# Altium integrated library Cap-Cer-SMD_V2.IntLib: 957 symbols (part 1 of 7) (continued)
## 1nF_0805N_16V_10%_X7R
designator C?, comment value 1.0nF  Voltage: 16V  Text1: 0805  (hidden comment: 1nF_C0805_16V_10%_X7R)
Cap Ceramic X7R; Manufacturer: Various; Part Number: 1.0nF 0805 16V 10% X7R; Tol: 10%; Package: CAPC0805X110N; EDM-PN: *; Text2: *; SAAB PN: *; DCE Part No: *
footprint CAPC0805X110N (Chip Capacitor, 0805, 2-Leads, Body 2.0x1.3mm, IPC Medium Density)
pins: 1, 2

## 1nF_0805N_50V_5%_C0G/NP0
designator C?, comment value 1.0nF  Voltage: 50V  Text1: 0805  (hidden comment: 1nF_C0805_50V_5%_C0G/NP0)
Cap Ceramic C0G/NP0; Manufacturer: Various; Part Number: 1.0nF 0805 50V 5% C0G/NP0; Tol: 5%; Package: CAPC0805X110N; EDM-PN: *; Text2: *; SAAB PN: *; DCE Part No: *
footprint CAPC0805X110N (Chip Capacitor, 0805, 2-Leads, Body 2.0x1.3mm, IPC Medium Density)
pins: 1, 2

## 1nF_0805N_50V_10%_X7R
designator C?, comment value 1.0nF  Voltage: 50V  Text1: 0805  (hidden comment: 1nF_C0805_50V_10%_X7R)
Cap Ceramic X7R; Manufacturer: Various; Part Number: 1.0nF 0805 50V 10% X7R; EDM-PN: CAP49; Tol: 10%; SAAB PN: 1AAB00007AEA; Package: CAPC0805X110N; Text2: *; DCE Part No: *
footprint CAPC0805X110N (Chip Capacitor, 0805, 2-Leads, Body 2.0x1.3mm, IPC Medium Density)
pins: 1, 2

## 1nF_0805N_50V_10%_X7R-DNF
designator C?, comment value (1.0nF)  Voltage: 50V  Text1: 0805  (hidden comment: 1nF_C0805_50V_10%_X7R-DNF)
Cap Ceramic X7R - Do not Fit; Manufacturer: Various; Part Number: DNF - 1.0nF 0805 50V 10% X7R; Tol: 10%; SAAB PN: 1AAB00007AEA; Package: CAPC0805X110N; EDM-PN: *; Text2: *; DCE Part No: *
footprint CAPC0805X110N (Chip Capacitor, 0805, 2-Leads, Body 2.0x1.3mm, IPC Medium Density)
pins: 1, 2

## 1nF_0805N_100V_10%_X7R
designator C?, comment value 1.0nF  Voltage: 100V  Text1: 0805  (hidden comment: 1nF_C0805_100V_10%_X7R)
Cap Ceramic X7R; Manufacturer: Various; Part Number: 1.0nF 0805 100V 10% X7R; Tol: 10%; Package: CAPC0805X110N; EDM-PN: *; Text2: *; SAAB PN: *; DCE Part No: *
footprint CAPC0805X110N (Chip Capacitor, 0805, 2-Leads, Body 2.0x1.3mm, IPC Medium Density)
pins: 1, 2

## 1nF_0805N_200V_10%_X7R
designator C?, comment value 1.0nF  Voltage: 200V  Text1: 0805  (hidden comment: 1nF_C0805_200V_10%_X7R)
Cap Ceramic X7R; Manufacturer: Various; Part Number: 1.0nF 0805 200V 10% X7R; Tol: 10%; Package: CAPC0805X110N; EDM-PN: *; Text2: *; SAAB PN: *; DCE Part No: *
footprint CAPC0805X110N (Chip Capacitor, 0805, 2-Leads, Body 2.0x1.3mm, IPC Medium Density)
pins: 1, 2

## 1nF_1206N_1kV_10%_X7R
designator C?, comment value 1.0nF  Voltage: 1kV  Text1: 1206  (hidden comment: 1.0nF_C1206_1kV_10%_X7R)
Cap Ceramic X7R; Manufacturer: Various; Part Number: 1.0nF 1206 1kV 10% X7R; Tol: 10%; Package: CAPC1206X135N; EDM-PN: *; Text2: *; SAAB PN: *; DCE Part No: *
footprint CAPC1206X135N (Chip Capacitor, 1206, 2-Leads, Body 3.2x1.6mm, IPC Medium Density)
pins: 1, 2

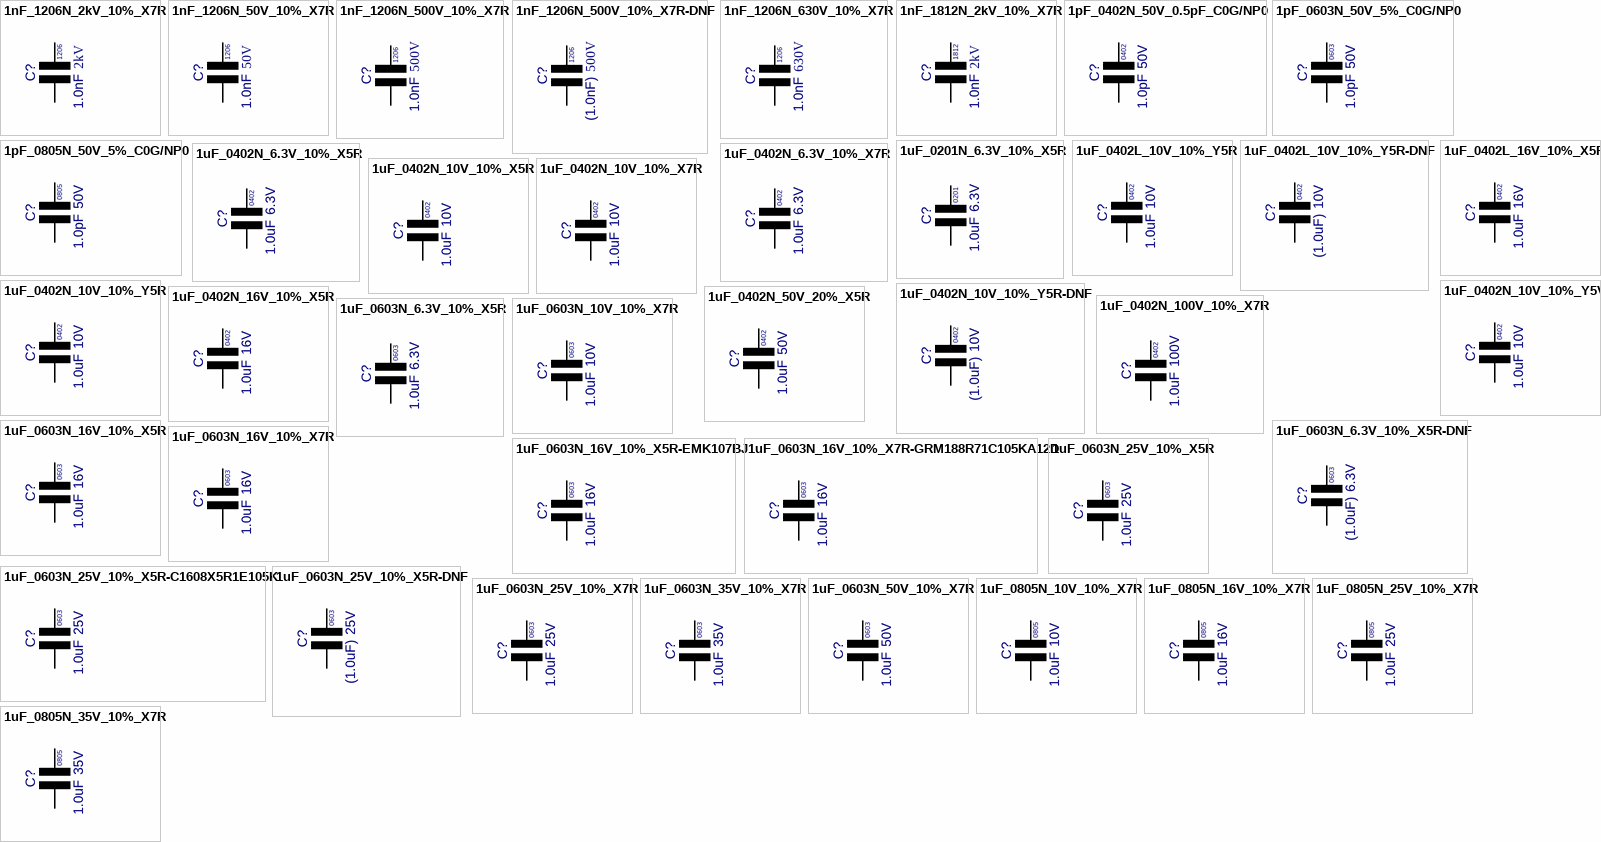
[diagram p2: symbols 1nF_1206N_2kV_10%_X7R to 1uF_0805N_35V_10%_X7R]

## 1nF_1206N_2kV_10%_X7R
designator C?, comment value 1.0nF  Voltage: 2kV  Text1: 1206  (hidden comment: 1.0nF_C1206_2kV_10%_X7R)
Cap Ceramic X7R; Manufacturer: Various; Part Number: 1.0nF 1206 2kV 10% X7R; EDM-PN: CAP777; Tol: 10%; Reutech PN: 5910-CA-0558; Package: CAPC1206X178N; Text2: *; SAAB PN: *; DCE Part No: *
footprint CAPC1206X178N (Chip Capacitor, 1206, 2-Leads, Body 3.2x1.6mm, IPC Medium Density)
pins: 1, 2

## 1nF_1206N_50V_10%_X7R
designator C?, comment value 1.0nF  Voltage: 50V  Text1: 1206  (hidden comment: 1.0nF_C1206_50V_10%_X7R)
Cap Ceramic X7R; Manufacturer: Various; Part Number: 1.0nF 1206 50V 10% X7R; Tol: 10%; Package: CAPC1206X135N; EDM-PN: *; Text2: *; SAAB PN: *; DCE Part No: *
footprint CAPC1206X135N (Chip Capacitor, 1206, 2-Leads, Body 3.2x1.6mm, IPC Medium Density)
pins: 1, 2

## 1nF_1206N_500V_10%_X7R
designator C?, comment value 1.0nF  Voltage: 500V  Text1: 1206  (hidden comment: 1.0nF_C1206_500V_10%_X7R)
Cap Ceramic X7R; Manufacturer: Various; Part Number: 1.0nF 1206 500V 10% X7R; Tol: 10%; Reutech PN: 5910-CA-0470; Package: CAPC1206X135N; EDM-PN: *; Text2: *; SAAB PN: *; DCE Part No: *
footprint CAPC1206X135N (Chip Capacitor, 1206, 2-Leads, Body 3.2x1.6mm, IPC Medium Density)
pins: 1, 2

## 1nF_1206N_500V_10%_X7R-DNF
designator C?, comment value (1.0nF)  Voltage: 500V  Text1: 1206  (hidden comment: 1.0nF_C1206_500V_10%_X7R-DNF)
Cap Ceramic X7R - Do not Fit; Manufacturer: Various; Part Number: DNF - 1.0nF 1206 500V 10% X7R; Tol: 10%; Reutech PN: 5910-CA-0470; Package: CAPC1206X135N; EDM-PN: *; Text2: *; SAAB PN: *; DCE Part No: *
footprint CAPC1206X135N (Chip Capacitor, 1206, 2-Leads, Body 3.2x1.6mm, IPC Medium Density)
pins: 1, 2

## 1nF_1206N_630V_10%_X7R
designator C?, comment value 1.0nF  Voltage: 630V  Text1: 1206  (hidden comment: 1.0nF_C1206_630V_10%_X7R)
Cap Ceramic X7R; Manufacturer: Various; Part Number: 1.0nF 1206 630V 10% X7R; Tol: 10%; Package: CAPC1206X135N; EDM-PN: *; Text2: *; SAAB PN: *; DCE Part No: *
footprint CAPC1206X135N (Chip Capacitor, 1206, 2-Leads, Body 3.2x1.6mm, IPC Medium Density)
pins: 1, 2

## 1nF_1812N_2kV_10%_X7R
designator C?, comment value 1.0nF  Voltage: 2kV  Text1: 1812  (hidden comment: 1.0nF_C1812_2kV_10%_X7R)
Cap Ceramic X7R; Manufacturer: Various; Part Number: 1.0nF 1812 2kV 10% X7R; Tol: 10%; Package: CAPC1812X280N; EDM-PN: *; Text2: *; SAAB PN: *; DCE Part No: *
footprint CAPC1812X280N (Chip Capacitor, 1812, 2-Leads, Body 4.5x3.2mm, IPC Medium Density)
pins: 1, 2

## 1pF_0402N_50V_0.5pF_C0G/NP0
designator C?, comment value 1.0pF  Voltage: 50V  Text1: 0402  (hidden comment: 1.0pF_C0402_50V_0.5_C0G/NP0)
Cap Ceramic C0G/NP0; Manufacturer: Various; Part Number: 1.0pF 0402 50V 0.5 C0G/NP0; Tol: 0.5pF; Package: CAPC0402X60N; EDM-PN: *; Text2: *; SAAB PN: *; DCE Part No: *
footprint CAPC0402X60N (Chip Capacitor, 0402, 2-Leads, Body 1.0x0.5mm, IPC Medium Density)
pins: 1, 2

## 1pF_0603N_50V_5%_C0G/NP0
designator C?, comment value 1.0pF  Voltage: 50V  Text1: 0603  (hidden comment: 1.0pF_C0603_50V_5%_C0G/NP0)
Cap Ceramic C0G/NP0; Manufacturer: Various; Part Number: 1.0pF 0603 50V 5% C0G/NP0; EDM-PN: CAP1349; Tol: 5%; Package: CAPC0603X85N; Text2: *; SAAB PN: *; DCE Part No: *
footprint CAPC0603X85N (Chip Capacitor, 0603, 2-Leads, Body 1.6x0.8mm, IPC Medium Density)
pins: 1, 2

## 1pF_0805N_50V_5%_C0G/NP0
designator C?, comment value 1.0pF  Voltage: 50V  Text1: 0805  (hidden comment: 1pF_C0805_50V_5%_C0G/NP0)
Cap Ceramic C0G/NP0; Manufacturer: Various; Part Number: 1.0pF 0805 50V 5% C0G/NP0; Tol: 0.5pF; Package: CAPC0805X110N; EDM-PN: *; Text2: *; SAAB PN: *; DCE Part No: *
footprint CAPC0805X110N (Chip Capacitor, 0805, 2-Leads, Body 2.0x1.3mm, IPC Medium Density)
pins: 1, 2

## 1uF_0201N_6.3V_10%_X5R
designator C?, comment value 1.0uF  Voltage: 6.3V  Text1: 0201  (hidden comment: 1uF_C0201_6.3V_10%_X5R)
Cap Ceramic X5R; Manufacturer: Various; Part Number: 1uF 0201 6.3V 10% X5R; Tol: 10%; Package: CAPC0201X33N; EDM-PN: *; Text2: *; SAAB PN: *; DCE Part No: *
footprint CAPC0201X33N (Chip Capacitor, 0201, 2-Leads, Body 0.6x0.3mm, IPC Medium Density)
pins: 1, 2

## 1uF_0402L_10V_10%_Y5R
designator C?, comment value 1.0uF  Voltage: 10V  Text1: 0402  (hidden comment: 1uF_C0402_10V_10%_X5R)
Cap Ceramic Y5R; Manufacturer: Various; Part Number: 1.0uF 0402 10V 10% Y5R; Tol: 10%; Package: CAPC0402X60L; EDM-PN: *; Text2: *; SAAB PN: *; DCE Part No: *
footprint CAPC0402X60L (Chip Capacitor, 0402, 2-Leads, Body 1.0x0.5mm, IPC High Density)
pins: 1, 2

## 1uF_0402L_10V_10%_Y5R-DNF
designator C?, comment value (1.0uF)  Voltage: 10V  Text1: 0402  (hidden comment: 1uF_C0402_10V_10%_X5R-DNF)
Cap Ceramic Y5R - Do not Fit; Manufacturer: Various; Part Number: DNF - 1.0uF 0402 10V 10% Y5R; Tol: 10%; Package: CAPC0402X60L; EDM-PN: *; Text2: *; SAAB PN: *; DCE Part No: *
footprint CAPC0402X60L (Chip Capacitor, 0402, 2-Leads, Body 1.0x0.5mm, IPC High Density)
pins: 1, 2

## 1uF_0402L_16V_10%_X5R
designator C?, comment value 1.0uF  Voltage: 16V  Text1: 0402  (hidden comment: 1uF_C0402_16V_10%_X5R)
Cap Ceramic X5R; Manufacturer: Various; Part Number: 1.0uF 0402 16V 10% X5R; EDM-PN: CAP863; Tol: 10%; Package: CAPC0402X60L; Text2: *; SAAB PN: *; DCE Part No: *
footprint CAPC0402X60L (Chip Capacitor, 0402, 2-Leads, Body 1.0x0.5mm, IPC High Density)
pins: 1, 2

## 1uF_0402N_6.3V_10%_X5R
designator C?, comment value 1.0uF  Voltage: 6.3V  Text1: 0402  (hidden comment: 1uF_C0402_6.3V_10%_X5R)
Cap Ceramic X5R; Manufacturer: Various; Part Number: 1.0uF 0402 6.3V 10% X5R; DCE Part No: 7167; EDM-PN: CAP330; Tol: 10%; Package: CAPC0402X60N; Text2: *; SAAB PN: *
footprint CAPC0402X60N (Chip Capacitor, 0402, 2-Leads, Body 1.0x0.5mm, IPC Medium Density)
pins: 1, 2

## 1uF_0402N_6.3V_10%_X7R
designator C?, comment value 1.0uF  Voltage: 6.3V  Text1: 0402  (hidden comment: 1uF_C0402_6.3V_10%_X7R)
Cap Ceramic X7R; Manufacturer: Various; Part Number: 1.0uF 0402 6.3V 10% X7R; Tol: 10%; Package: CAPC0402X60N; EDM-PN: *; Text2: *; SAAB PN: *; DCE Part No: *
footprint CAPC0402X60N (Chip Capacitor, 0402, 2-Leads, Body 1.0x0.5mm, IPC Medium Density)
pins: 1, 2

## 1uF_0402N_10V_10%_X5R
designator C?, comment value 1.0uF  Voltage: 10V  Text1: 0402  (hidden comment: 1uF_C0402_10V_10%_X5R)
Cap Ceramic X5R; Manufacturer: Various; Part Number: 1.0uF 0402 10V 10% X5R; Tol: 10%; Package: CAPC0402X60N; EDM-PN: *; Text2: *; SAAB PN: *; DCE Part No: *
footprint CAPC0402X60N (Chip Capacitor, 0402, 2-Leads, Body 1.0x0.5mm, IPC Medium Density)
pins: 1, 2

## 1uF_0402N_10V_10%_X7R
designator C?, comment value 1.0uF  Voltage: 10V  Text1: 0402  (hidden comment: 1uF_C0402_10V_10%_X7R)
Cap Ceramic X7R; Manufacturer: Various; Part Number: 1.0uF 0402 10V 10% X7R; Tol: 10%; Package: CAPC0402X60N; EDM-PN: *; Text2: *; SAAB PN: *; DCE Part No: *
footprint CAPC0402X60N (Chip Capacitor, 0402, 2-Leads, Body 1.0x0.5mm, IPC Medium Density)
pins: 1, 2

## 1uF_0402N_10V_10%_Y5R
designator C?, comment value 1.0uF  Voltage: 10V  Text1: 0402  (hidden comment: 1uF_C0402_10V_10%_X5R)
Cap Ceramic Y5R; Manufacturer: Various; Part Number: 1.0uF 0402 10V 10% Y5R; Tol: 10%; Package: CAPC0402X60N; EDM-PN: *; Text2: *; SAAB PN: *; DCE Part No: *
footprint CAPC0402X60N (Chip Capacitor, 0402, 2-Leads, Body 1.0x0.5mm, IPC Medium Density)
pins: 1, 2

## 1uF_0402N_10V_10%_Y5R-DNF
designator C?, comment value (1.0uF)  Voltage: 10V  Text1: 0402  (hidden comment: 1uF_C0402_10V_10%_X5R-DNF)
Cap Ceramic Y5R - Do not Fit; Manufacturer: Various; Part Number: DNF - 1.0uF 0402 10V 10% Y5R; Tol: 10%; Package: CAPC0402X60N; EDM-PN: *; Text2: *; SAAB PN: *; DCE Part No: *
footprint CAPC0402X60N (Chip Capacitor, 0402, 2-Leads, Body 1.0x0.5mm, IPC Medium Density)
pins: 1, 2

## 1uF_0402N_10V_10%_Y5V
designator C?, comment value 1.0uF  Voltage: 10V  Text1: 0402  (hidden comment: 1uF_C0402_10V_10%_X5V)
Cap Ceramic Y5R; Manufacturer: Various; Part Number: 1.0uF 0402 10V 10% Y5V; EDM-PN: CAP505; Tol: 10%; Package: CAPC0402X60N; Text2: *; SAAB PN: *; DCE Part No: *
footprint CAPC0402X60N (Chip Capacitor, 0402, 2-Leads, Body 1.0x0.5mm, IPC Medium Density)
pins: 1, 2

## 1uF_0402N_16V_10%_X5R
designator C?, comment value 1.0uF  Voltage: 16V  Text1: 0402  (hidden comment: 1uF_C0402_16V_10%_X5R)
Cap Ceramic X5R; Manufacturer: Various; Part Number: 1.0uF 0402 16V 10% X5R; EDM-PN: CAP863; Tol: 10%; Package: CAPC0402X60N; Text2: *; SAAB PN: *; DCE Part No: *
footprint CAPC0402X60N (Chip Capacitor, 0402, 2-Leads, Body 1.0x0.5mm, IPC Medium Density)
pins: 1, 2

## 1uF_0402N_50V_20%_X5R
designator C?, comment value 1.0uF  Voltage: 50V  Text1: 0402  (hidden comment: 1uF_C0402_50V_20%_X5R)
Cap Ceramic X5R; Manufacturer: Various; Part Number: 1.0uF 0402 50V 20% X5R; EDM-PN: CAP1424; Tol: 20%; Package: CAPC0402X60N; Text2: *; SAAB PN: *; DCE Part No: *
footprint CAPC0402X60N (Chip Capacitor, 0402, 2-Leads, Body 1.0x0.5mm, IPC Medium Density)
pins: 1, 2

## 1uF_0402N_100V_10%_X7R
designator C?, comment value 1.0uF  Voltage: 100V  Text1: 0402  (hidden comment: 1uF_C0402_100V_10%_X7R)
Cap Ceramic X7R; Manufacturer: Various; Part Number: 1.0uF 0402 100V 10% X7R; Tol: 10%; Package: CAPC0402X60N; EDM-PN: *; Text2: *; SAAB PN: *; DCE Part No: *
footprint CAPC0402X60N (Chip Capacitor, 0402, 2-Leads, Body 1.0x0.5mm, IPC Medium Density)
pins: 1, 2

## 1uF_0603N_6.3V_10%_X5R
designator C?, comment value 1.0uF  Voltage: 6.3V  Text1: 0603  (hidden comment: 1.0uF_C0603_6.3V_10%_X5R)
Cap Ceramic X5R; Manufacturer: Various; Part Number: 1.0uF 0603 6.3V 10% X5R; EDM-PN: CAP1238; Tol: 10%; Package: CAPC0603X85N; Text2: *; SAAB PN: *; DCE Part No: *
footprint CAPC0603X85N (Chip Capacitor, 0603, 2-Leads, Body 1.6x0.8mm, IPC Medium Density)
pins: 1, 2

## 1uF_0603N_6.3V_10%_X5R-DNF
designator C?, comment value (1.0uF)  Voltage: 6.3V  Text1: 0603  (hidden comment: 1.0uF_C0603_6.3V_10%_X5R)
Cap Ceramic X5R - Do not Fit; Manufacturer: Various; Part Number: DNF - 1.0uF 0603 6.3V 10% X5R; EDM-PN: CAP1238; Tol: 10%; Package: CAPC0603X85N; Text2: *; SAAB PN: *; DCE Part No: *
footprint CAPC0603X85N (Chip Capacitor, 0603, 2-Leads, Body 1.6x0.8mm, IPC Medium Density)
pins: 1, 2

## 1uF_0603N_10V_10%_X7R
designator C?, comment value 1.0uF  Voltage: 10V  Text1: 0603  (hidden comment: 1.0uF_C0603_10V_10%_X7R)
Cap Ceramic X7R; Manufacturer: Various; Part Number: 1.0uF 0603 10V 10% X7R; EDM-PN: CAP1037; Tol: 10%; Reutech PN: 5910-CA-0440; Package: CAPC0603X85N; Text2: *; SAAB PN: *; DCE Part No: *
footprint CAPC0603X85N (Chip Capacitor, 0603, 2-Leads, Body 1.6x0.8mm, IPC Medium Density)
pins: 1, 2

## 1uF_0603N_16V_10%_X5R
designator C?, comment value 1.0uF  Voltage: 16V  Text1: 0603  (hidden comment: 1.0uF_C0603_16V_10%_X5R)
Cap Ceramic X5R; Manufacturer: Various; Part Number: 1.0uF 0603 16V 10% X5R; EDM-PN: CAP736; Tol: 10%; Reutech PN: 5910-CA-0532; Package: CAPC0603X85N; Text2: *; SAAB PN: *; DCE Part No: *
footprint CAPC0603X85N (Chip Capacitor, 0603, 2-Leads, Body 1.6x0.8mm, IPC Medium Density)
pins: 1, 2

## 1uF_0603N_16V_10%_X5R-EMK107BJ
designator C?, comment value 1.0uF  Voltage: 16V  Text1: 0603  (hidden comment: EMK107BJ105KA)
Cap Ceramic X5R; Manufacturer: Taiyo Yuden; EDM-PN: CAP736; Tol: 10%; Part Number: EMK107BJ105KA; Package: CAPC0603X85N; Text2: *; SAAB PN: *; DCE Part No: *
footprint CAPC0603X85N (Chip Capacitor, 0603, 2-Leads, Body 1.6x0.8mm, IPC Medium Density)
pins: 1, 2

## 1uF_0603N_16V_10%_X7R
designator C?, comment value 1.0uF  Voltage: 16V  Text1: 0603  (hidden comment: 1.0uF_C0603_16V_10%_X7R)
Cap Ceramic X7R; Manufacturer: Various; Part Number: 1.0uF 0603 16V 10% X7R; Tol: 10%; Reutech PN: 5910-CA-0532; Package: CAPC0603X85N; EDM-PN: *; Text2: *; SAAB PN: *; DCE Part No: *
footprint CAPC0603X85N (Chip Capacitor, 0603, 2-Leads, Body 1.6x0.8mm, IPC Medium Density)
pins: 1, 2

## 1uF_0603N_16V_10%_X7R-GRM188R71C105KA12D
designator C?, comment value 1.0uF  Voltage: 16V  Text1: 0603  (hidden comment: GRM188R71C105KA12D)
Cap Ceramic X7R; Manufacturer: Murata; Tol: 10%; Reutech PN: 5910-CA-0532; Part Number: GRM188R71C105KA12D; Package: CAPC0603X85N; EDM-PN: *; Text2: *; SAAB PN: *; DCE Part No: *
footprint CAPC0603X85N (Chip Capacitor, 0603, 2-Leads, Body 1.6x0.8mm, IPC Medium Density)
pins: 1, 2

## 1uF_0603N_25V_10%_X5R
designator C?, comment value 1.0uF  Voltage: 25V  Text1: 0603  (hidden comment: 1.0uF_C0603_25V_10%_X5R)
Cap Ceramic X5R; Manufacturer: Various; Part Number: 1.0uF 0603 25V 10% X5R; EDM-PN: CAP519; Tol: 10%; Package: CAPC0603X85N; Text2: *; SAAB PN: *; DCE Part No: *
footprint CAPC0603X85N (Chip Capacitor, 0603, 2-Leads, Body 1.6x0.8mm, IPC Medium Density)
pins: 1, 2

## 1uF_0603N_25V_10%_X5R-C1608X5R1E105K
designator C?, comment value 1.0uF  Voltage: 25V  Text1: 0603  (hidden comment: C1608X5R1E105K)
Cap Ceramic X5R; Manufacturer: TDK; Tol: 10%; Part Number: C1608X5R1E105K; Package: CAPC0603X85N; EDM-PN: *; Text2: *; SAAB PN: *; DCE Part No: *
footprint CAPC0603X85N (Chip Capacitor, 0603, 2-Leads, Body 1.6x0.8mm, IPC Medium Density)
pins: 1, 2

## 1uF_0603N_25V_10%_X5R-DNF
designator C?, comment value (1.0uF)  Voltage: 25V  Text1: 0603  (hidden comment: 1.0uF_C0603_25V_10%_X5R-DNF)
Cap Ceramic X5R - Do not Fit; Manufacturer: Various; Part Number: DNF - 1.0uF 0603 25V 10% X5R; EDM-PN: CAP519; Tol: 10%; Package: CAPC0603X85N; Text2: *; SAAB PN: *; DCE Part No: *
footprint CAPC0603X85N (Chip Capacitor, 0603, 2-Leads, Body 1.6x0.8mm, IPC Medium Density)
pins: 1, 2

## 1uF_0603N_25V_10%_X7R
designator C?, comment value 1.0uF  Voltage: 25V  Text1: 0603  (hidden comment: 1.0uF_C0603_25V_10%_X7R)
Cap Ceramic X7R; Manufacturer: Various; Part Number: 1.0uF 0603 25V 10% X7R; EDM-PN: CAP989; Tol: 10%; Reutech PN: 5910-CA-0532; SAAB PN: 1AAB00438AEA; Package: CAPC0603X85N; Text2: *; DCE Part No: *
footprint CAPC0603X85N (Chip Capacitor, 0603, 2-Leads, Body 1.6x0.8mm, IPC Medium Density)
pins: 1, 2

## 1uF_0603N_35V_10%_X7R
designator C?, comment value 1.0uF  Voltage: 35V  Text1: 0603  (hidden comment: 1.0uF_C0603_35V_10%_X7R)
Cap Ceramic X7R; Manufacturer: Various; Part Number: 1.0uF 0603 35V 10% X7R; EDM-PN: CAP578; Tol: 10%; Package: CAPC0603X85N; Text2: *; SAAB PN: *; DCE Part No: *
footprint CAPC0603X85N (Chip Capacitor, 0603, 2-Leads, Body 1.6x0.8mm, IPC Medium Density)
pins: 1, 2

## 1uF_0603N_50V_10%_X7R
designator C?, comment value 1.0uF  Voltage: 50V  Text1: 0603  (hidden comment: 1.0uF_C0603_50V_10%_X7R)
Cap Ceramic X7R; Manufacturer: Various; Part Number: 1.0uF 0603 50V 10% X7R; EDM-PN: CAP649; Tol: 10%; Reutech PN: 5910-CA-0547; Package: CAPC0603X85N; Text2: *; SAAB PN: *; DCE Part No: *
footprint CAPC0603X85N (Chip Capacitor, 0603, 2-Leads, Body 1.6x0.8mm, IPC Medium Density)
pins: 1, 2

## 1uF_0805N_10V_10%_X7R
designator C?, comment value 1.0uF  Voltage: 10V  Text1: 0805  (hidden comment: 1uF_C0805_10V_10%_X7R)
Cap Ceramic X7R; Manufacturer: Various; Part Number: 1.0uF 0805 10V 10% X7R; Tol: 10%; Package: CAPC0805X110N; EDM-PN: *; Text2: *; SAAB PN: *; DCE Part No: *
footprint CAPC0805X110N (Chip Capacitor, 0805, 2-Leads, Body 2.0x1.3mm, IPC Medium Density)
pins: 1, 2

## 1uF_0805N_16V_10%_X7R
designator C?, comment value 1.0uF  Voltage: 16V  Text1: 0805  (hidden comment: 1uF_C0805_16V_10%_X7R)
Cap Ceramic X7R; Manufacturer: Various; Part Number: 1.0uF 0805 16V 10% X7R; EDM-PN: CAP307; Tol: 10%; Reutech PN: 5910-CA-0467; Package: CAPC0805X110N; Text2: *; SAAB PN: *; DCE Part No: *
footprint CAPC0805X110N (Chip Capacitor, 0805, 2-Leads, Body 2.0x1.3mm, IPC Medium Density)
pins: 1, 2

## 1uF_0805N_25V_10%_X7R
designator C?, comment value 1.0uF  Voltage: 25V  Text1: 0805  (hidden comment: 1uF_C0805_25V_10%_X7R)
Cap Ceramic X7R; Manufacturer: Various; Part Number: 1.0uF 0805 25V 10% X7R; Tol: 10%; Package: CAPC0805X110N; EDM-PN: *; Text2: *; SAAB PN: *; DCE Part No: *
footprint CAPC0805X110N (Chip Capacitor, 0805, 2-Leads, Body 2.0x1.3mm, IPC Medium Density)
pins: 1, 2

## 1uF_0805N_35V_10%_X7R
designator C?, comment value 1.0uF  Voltage: 35V  Text1: 0805  (hidden comment: 1uF_C0805_35V_10%_X7R)
Cap Ceramic X7R; Manufacturer: Various; Part Number: 1.0uF 0805 35V 10% X7R; Tol: 10%; Package: CAPC0805X110N; EDM-PN: *; Text2: *; SAAB PN: *; DCE Part No: *
footprint CAPC0805X110N (Chip Capacitor, 0805, 2-Leads, Body 2.0x1.3mm, IPC Medium Density)
pins: 1, 2

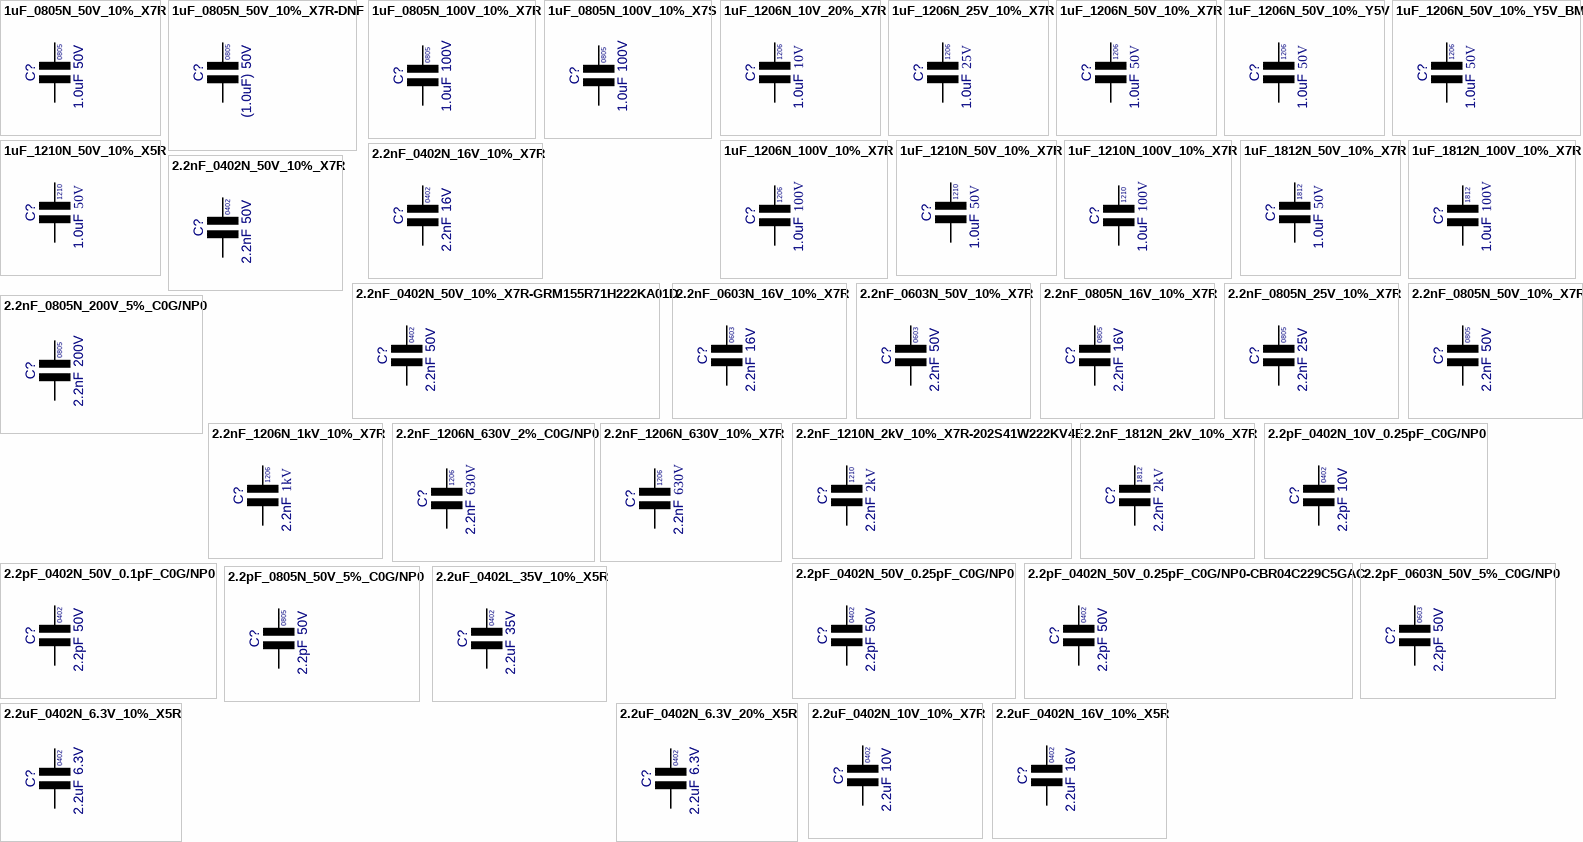
[diagram p3: symbols 1uF_0805N_50V_10%_X7R to 2.2uF_0402N_16V_10%_X5R]

## 1uF_0805N_50V_10%_X7R
designator C?, comment value 1.0uF  Voltage: 50V  Text1: 0805  (hidden comment: 1uF_C0805_50V_10%_X7R)
Cap Ceramic X7R; Manufacturer: Various; Part Number: 1.0uF 0805 50V 10% X7R; EDM-PN: CAP375; Tol: 10%; Reutech PN: 5910-CA-0494; Package: CAPC0805X135N; Text2: *; SAAB PN: *; DCE Part No: *
footprint CAPC0805X135N (Chip Capacitor, 0805, 2-Leads, Body 2.0x1.3mm, IPC Medium Density)
pins: 1, 2

## 1uF_0805N_50V_10%_X7R-DNF
designator C?, comment value (1.0uF)  Voltage: 50V  Text1: 0805  (hidden comment: 1uF_C0805_50V_10%_X7R-DNF)
Cap Ceramic X7R - Do not Fit; Manufacturer: Various; Part Number: DNF - 1.0uF 0805 50V 10% X7R; EDM-PN: CAP375; Tol: 10%; Package: CAPC0805X135N; Text2: *; SAAB PN: *; DCE Part No: *
footprint CAPC0805X135N (Chip Capacitor, 0805, 2-Leads, Body 2.0x1.3mm, IPC Medium Density)
pins: 1, 2

## 1uF_0805N_100V_10%_X7R
designator C?, comment value 1.0uF  Voltage: 100V  Text1: 0805  (hidden comment: 1uF_C0805_100V_10%_X7R)
Cap Ceramic X7R; Manufacturer: Various; Part Number: 1.0uF 0805 100V 10% X7R; Tol: 10%; Reutech PN: 5910-CA-0548; Package: CAPC0805X135N; EDM-PN: *; Text2: *; SAAB PN: *; DCE Part No: *
footprint CAPC0805X135N (Chip Capacitor, 0805, 2-Leads, Body 2.0x1.3mm, IPC Medium Density)
pins: 1, 2

## 1uF_0805N_100V_10%_X7S
designator C?, comment value 1.0uF  Voltage: 100V  Text1: 0805  (hidden comment: 1uF_C0805_100V_10%_X7S)
Cap Ceramic X7S; Manufacturer: Various; Part Number: 1.0uF 0805 100V 10% X7S; Tol: 10%; Package: CAPC0805X135N; EDM-PN: *; Text2: *; SAAB PN: *; DCE Part No: *
footprint CAPC0805X135N (Chip Capacitor, 0805, 2-Leads, Body 2.0x1.3mm, IPC Medium Density)
pins: 1, 2

## 1uF_1206N_10V_20%_X7R
designator C?, comment value 1.0uF  Voltage: 10V  Text1: 1206  (hidden comment: 1.0uF_C1206_10V_20%_X7R)
Cap Ceramic X7R; Manufacturer: Various; Part Number: 1.0uF 1206 10V 20% X7R; Tol: 20%; Package: CAPC1206X135N; EDM-PN: *; Text2: *; Reutech PN: *; SAAB PN: *; DCE Part No: *
footprint CAPC1206X135N (Chip Capacitor, 1206, 2-Leads, Body 3.2x1.6mm, IPC Medium Density)
pins: 1, 2

## 1uF_1206N_25V_10%_X7R
designator C?, comment value 1.0uF  Voltage: 25V  Text1: 1206  (hidden comment: 1.0uF_C1206_25V_10%_X7R)
Cap Ceramic X7R; Manufacturer: Various; Part Number: 1.0uF 1206 25V 10% X7R; EDM-PN: CAP393; Tol: 10%; Reutech PN: 5910-CA-0416; Package: CAPC1206X135N; Text2: *; SAAB PN: *; DCE Part No: *
footprint CAPC1206X135N (Chip Capacitor, 1206, 2-Leads, Body 3.2x1.6mm, IPC Medium Density)
pins: 1, 2

## 1uF_1206N_50V_10%_X7R
designator C?, comment value 1.0uF  Voltage: 50V  Text1: 1206  (hidden comment: 1.0uF_C1206_50V_10%_X7R)
Cap Ceramic X7R; Manufacturer: Various; Part Number: 1.0uF 1206 50V 10% X7R; EDM-PN: CAP692; Tol: 10%; Reutech PN: 5910-CA-0473; Package: CAPC1206X135N; Text2: *; SAAB PN: *; DCE Part No: *
footprint CAPC1206X135N (Chip Capacitor, 1206, 2-Leads, Body 3.2x1.6mm, IPC Medium Density)
pins: 1, 2

## 1uF_1206N_50V_10%_Y5V
designator C?, comment value 1.0uF  Voltage: 50V  Text1: 1206  (hidden comment: 1.0uF_C1206_50V_10%_Y5V)
Cap Ceramic Y5V; Manufacturer: Various; Part Number: 1.0uF 1206 50V 10% Y5V; Tol: 10%; Package: CAPC1206X135N; EDM-PN: *; Text2: *; SAAB PN: *; DCE Part No: *
footprint CAPC1206X135N (Chip Capacitor, 1206, 2-Leads, Body 3.2x1.6mm, IPC Medium Density)
pins: 1, 2

## 1uF_1206N_50V_10%_Y5V_BME
designator C?, comment value 1.0uF  Voltage: 50V  Text1: 1206  (hidden comment: 1.0uF_C1206_50V_10%_Y5V-BME)
Cap Ceramic Y5V - BME; Manufacturer: Various; Part Number: 1.0uF 1206 50V 10% Y5V-BME; Tol: 10%; Package: CAPC1206X135N; EDM-PN: *; Text2: *; SAAB PN: *; DCE Part No: *
footprint CAPC1206X135N (Chip Capacitor, 1206, 2-Leads, Body 3.2x1.6mm, IPC Medium Density)
pins: 1, 2

## 1uF_1206N_100V_10%_X7R
designator C?, comment value 1.0uF  Voltage: 100V  Text1: 1206  (hidden comment: 1.0uF_C1206_100V_10%_X7R)
Cap Ceramic X7R; Manufacturer: Various; Part Number: 1.0uF 1206 100V 10% X7R; Tol: 10%; Package: CAPC1206X178N; EDM-PN: *; Text2: *; Reutech PN: *; SAAB PN: *; DCE Part No: *
footprint CAPC1206X178N (Chip Capacitor, 1206, 2-Leads, Body 3.2x1.6mm, IPC Medium Density)
pins: 1, 2

## 1uF_1210N_50V_10%_X5R
designator C?, comment value 1.0uF  Voltage: 50V  Text1: 1210  (hidden comment: 1.0uF_C1210_50V_10%_X5R)
Cap Ceramic X5R; Manufacturer: Various; Part Number: 1.0uF 1210 50V 10% X5R; EDM-PN: CAP667; Tol: 10%; SAAB PN: 1AAB00208AEA; Package: CAPC1210X180N; Text2: *; DCE Part No: *
footprint CAPC1210X180N (Chip Capacitor, 1210, 2-Leads, Body 3.2x2.5mm, IPC Medium Density)
pins: 1, 2

## 1uF_1210N_50V_10%_X7R
designator C?, comment value 1.0uF  Voltage: 50V  Text1: 1210  (hidden comment: 1.0uF_C1210_50V_10%_X7R)
Cap Ceramic X7R; Manufacturer: Various; Part Number: 1.0uF 1210 50V 10% X7R; Tol: 10%; Package: CAPC1210X180N; EDM-PN: *; Text2: *; SAAB PN: *; DCE Part No: *
footprint CAPC1210X180N (Chip Capacitor, 1210, 2-Leads, Body 3.2x2.5mm, IPC Medium Density)
pins: 1, 2

## 1uF_1210N_100V_10%_X7R
designator C?, comment value 1.0uF  Voltage: 100V  Text1: 1210  (hidden comment: 1.0uF_C1210_100V_10%_X7R)
Cap Ceramic X7R; Manufacturer: Various; Part Number: 1.0uF 1210 100V 10% X7R; Tol: 10%; Package: CAPC1210X180N; EDM-PN: *; Text2: *; SAAB PN: *; DCE Part No: *
footprint CAPC1210X180N (Chip Capacitor, 1210, 2-Leads, Body 3.2x2.5mm, IPC Medium Density)
pins: 1, 2

## 1uF_1812N_50V_10%_X7R
designator C?, comment value 1.0uF  Voltage: 50V  Text1: 1812  (hidden comment: 1uF_C1812_50V_10%_X7R)
Cap Ceramic X7R; Manufacturer: Various; Part Number: 1uF 1812 50V 10% X7R; Tol: 10%; Package: CAPC1812X135N; EDM-PN: *; Text2: *; SAAB PN: *; DCE Part No: *
footprint CAPC1812X135N (Chip Capacitor, 1812, 2-Leads, Body 4.5x3.2mm, IPC Medium Density)
pins: 1, 2

## 1uF_1812N_100V_10%_X7R
designator C?, comment value 1.0uF  Voltage: 100V  Text1: 1812  (hidden comment: 1uF_C1812_100V_10%_X7R)
Cap Ceramic X7R; Manufacturer: Various; Part Number: 1uF 1812 100V 10% X7R; Tol: 10%; Package: CAPC1812X135N; EDM-PN: *; Text2: *; SAAB PN: *; DCE Part No: *
footprint CAPC1812X135N (Chip Capacitor, 1812, 2-Leads, Body 4.5x3.2mm, IPC Medium Density)
pins: 1, 2

## 2.2nF_0402N_16V_10%_X7R
designator C?, comment value 2.2nF  Voltage: 16V  Text1: 0402  (hidden comment: 2.2nF_C0402_16V_10%_X7R)
Cap Ceramic X7R; Manufacturer: Various; Part Number: 2.2nF 0402 16V 10% X7R; Tol: 10%; Package: CAPC0402X60N; EDM-PN: *; Text2: *; SAAB PN: *; DCE Part No: *
footprint CAPC0402X60N (Chip Capacitor, 0402, 2-Leads, Body 1.0x0.5mm, IPC Medium Density)
pins: 1, 2

## 2.2nF_0402N_50V_10%_X7R
designator C?, comment value 2.2nF  Voltage: 50V  Text1: 0402  (hidden comment: 2.2nF_C0402_50V_10%_X7R)
Cap Ceramic X7R; Manufacturer: Various; Part Number: 2.2nF 0402 50V 10% X7R; Tol: 10%; Package: CAPC0402X60N; EDM-PN: *; Text2: *; SAAB PN: *; DCE Part No: *
footprint CAPC0402X60N (Chip Capacitor, 0402, 2-Leads, Body 1.0x0.5mm, IPC Medium Density)
pins: 1, 2

## 2.2nF_0402N_50V_10%_X7R-GRM155R71H222KA01D
designator C?, comment value 2.2nF  Voltage: 50V  Text1: 0402  (hidden comment: GRM155R71H222KA01D)
Cap Ceramic X7R; Manufacturer: Murata; Tol: 10%; Part Number: GRM155R71H222KA01D; Package: CAPC0402X60N; EDM-PN: *; Text2: *; SAAB PN: *; DCE Part No: *
footprint CAPC0402X60N (Chip Capacitor, 0402, 2-Leads, Body 1.0x0.5mm, IPC Medium Density)
pins: 1, 2

## 2.2nF_0603N_16V_10%_X7R
designator C?, comment value 2.2nF  Voltage: 16V  Text1: 0603  (hidden comment: 2.2nF_C0603_16V_10%_X7R)
Cap Ceramic X7R; Manufacturer: Various; Part Number: 2.2nF 0603 16V 10% X7R; Tol: 10%; Package: CAPC0603X85N; EDM-PN: *; Text2: *; SAAB PN: *; DCE Part No: *
footprint CAPC0603X85N (Chip Capacitor, 0603, 2-Leads, Body 1.6x0.8mm, IPC Medium Density)
pins: 1, 2

## 2.2nF_0603N_50V_10%_X7R
designator C?, comment value 2.2nF  Voltage: 50V  Text1: 0603  (hidden comment: 2.2nF_C0603_50V_10%_X7R)
Cap Ceramic X7R; Manufacturer: Various; Part Number: 2.2nF 0603 50V 10% X7R; Tol: 10%; Package: CAPC0603X85N; EDM-PN: *; Text2: *; SAAB PN: *; DCE Part No: *
footprint CAPC0603X85N (Chip Capacitor, 0603, 2-Leads, Body 1.6x0.8mm, IPC Medium Density)
pins: 1, 2

## 2.2nF_0805N_16V_10%_X7R
designator C?, comment value 2.2nF  Voltage: 16V  Text1: 0805  (hidden comment: 2.2nF_C0805_16V_10%_X7R)
Cap Ceramic X7R; Manufacturer: Various; Part Number: 2.2nF 0805 16V 10% X7R; Tol: 10%; Package: CAPC0805X110N; EDM-PN: *; Text2: *; SAAB PN: *; DCE Part No: *
footprint CAPC0805X110N (Chip Capacitor, 0805, 2-Leads, Body 2.0x1.3mm, IPC Medium Density)
pins: 1, 2

## 2.2nF_0805N_25V_10%_X7R
designator C?, comment value 2.2nF  Voltage: 25V  Text1: 0805  (hidden comment: 2.2nF_C0805_25V_10%_X7R)
Cap Ceramic X7R; Manufacturer: Various; Part Number: 2.2nF 0805 25V 10% X7R; Tol: 10%; Package: CAPC0805X110N; EDM-PN: *; Text2: *; SAAB PN: *; DCE Part No: *
footprint CAPC0805X110N (Chip Capacitor, 0805, 2-Leads, Body 2.0x1.3mm, IPC Medium Density)
pins: 1, 2

## 2.2nF_0805N_50V_10%_X7R
designator C?, comment value 2.2nF  Voltage: 50V  Text1: 0805  (hidden comment: 2.2nF_C0805_50V_10%_X7R)
Cap Ceramic X7R; Manufacturer: Various; Part Number: 2.2nF 0805 50V 10% X7R; Tol: 10%; Package: CAPC0805X110N; EDM-PN: *; Text2: *; SAAB PN: *; DCE Part No: *
footprint CAPC0805X110N (Chip Capacitor, 0805, 2-Leads, Body 2.0x1.3mm, IPC Medium Density)
pins: 1, 2

## 2.2nF_0805N_200V_5%_C0G/NP0
designator C?, comment value 2.2nF  Voltage: 200V  Text1: 0805  (hidden comment: 2.2nF_C0805_200V_5%_C0G/NP0)
Cap Ceramic C0G/NP0; Manufacturer: Various; Part Number: 2.2nF 0805 200V 5% C0G/NP0; Tol: 5%; Package: CAPC0805X110N; EDM-PN: *; Text2: *; SAAB PN: *; DCE Part No: *
footprint CAPC0805X110N (Chip Capacitor, 0805, 2-Leads, Body 2.0x1.3mm, IPC Medium Density)
pins: 1, 2

## 2.2nF_1206N_1kV_10%_X7R
designator C?, comment value 2.2nF  Voltage: 1kV  Text1: 1206  (hidden comment: 2.2nF_C1206_1kV_10%_X7R)
Cap Ceramic X7R; Manufacturer: Various; Part Number: 2.2nF 1206 1kV 10% X7R; Tol: 10%; Package: CAPC1206X135N; EDM-PN: *; Text2: *; SAAB PN: *; DCE Part No: *
footprint CAPC1206X135N (Chip Capacitor, 1206, 2-Leads, Body 3.2x1.6mm, IPC Medium Density)
pins: 1, 2

## 2.2nF_1206N_630V_2%_C0G/NP0
designator C?, comment value 2.2nF  Voltage: 630V  Text1: 1206  (hidden comment: 2.2nF_C1206_630V_2%_C0G/NP0)
Cap Ceramic C0G/NP0; Manufacturer: Various; Part Number: 2.2nF 1206 630V 2% C0G/NP0; Tol: 2%; Package: CAPC1206X135N; EDM-PN: *; Text2: *; SAAB PN: *; DCE Part No: *
footprint CAPC1206X135N (Chip Capacitor, 1206, 2-Leads, Body 3.2x1.6mm, IPC Medium Density)
pins: 1, 2

## 2.2nF_1206N_630V_10%_X7R
designator C?, comment value 2.2nF  Voltage: 630V  Text1: 1206  (hidden comment: 2.2nF_C1206_630V_10%_X7R)
Cap Ceramic X7R; Manufacturer: Various; Part Number: 2.2nF 1206 630V 10% X7R; Tol: 10%; Package: CAPC1206X135N; EDM-PN: *; Text2: *; SAAB PN: *; DCE Part No: *
footprint CAPC1206X135N (Chip Capacitor, 1206, 2-Leads, Body 3.2x1.6mm, IPC Medium Density)
pins: 1, 2